# Altium footprint library KNR_Kurs.PcbLib: 250 footprints (part 14 of 16)
Each footprint in its own frame and in the unit in brackets; x right, y up, seen from the top. Pads: shape width x height; smd on the part's side, far side on the other; paste and mask are expansions set on the pad; w line width, h text height; cw(c..) or ccw(c..) is an arc to the next point about the centre after c.
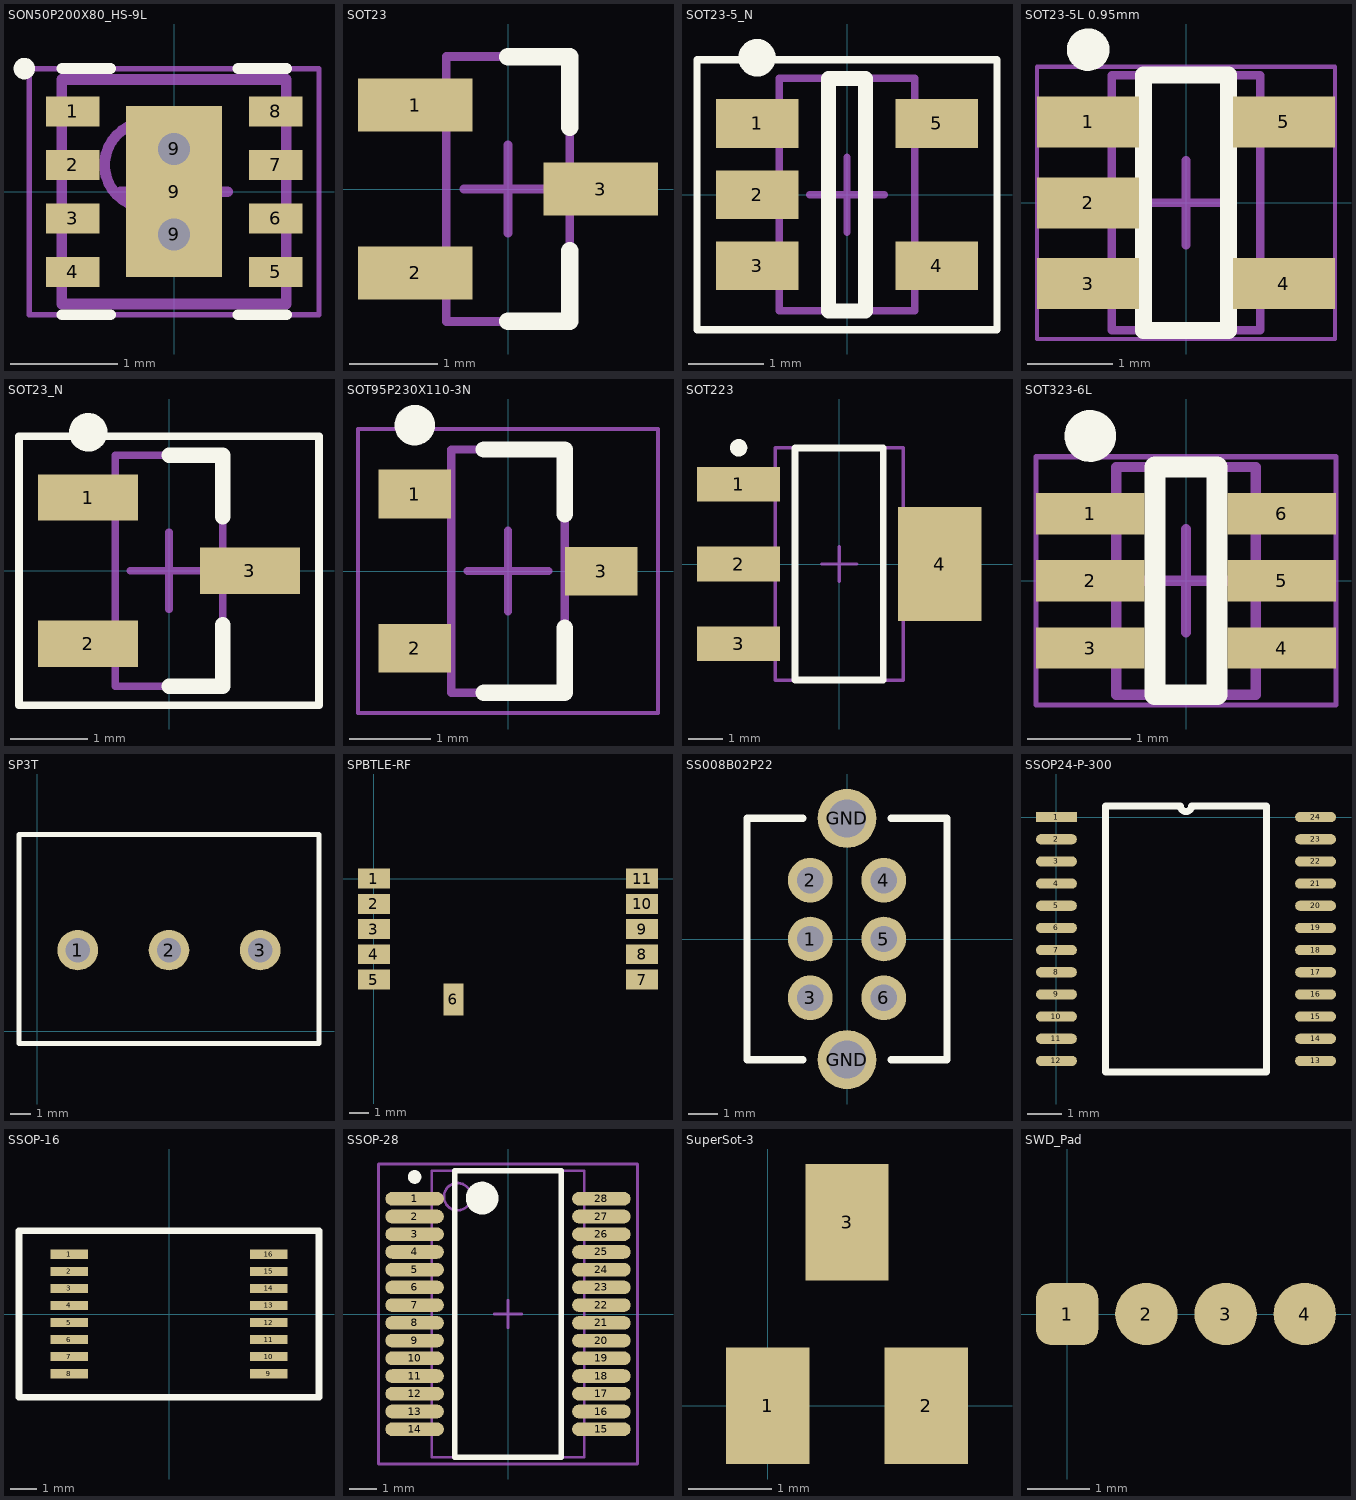
[diagram p13: the footprints below, top view; thin cyan lines are the x and y axes]

## SON50P200X80_HS-9L [mm] "SON, 8-Leads, Body 2,00x2,00mm, Pitch 0,50mm, Thermal Pad 1,60x0,69mm, IPC High Density"
height 0.8
pads (11):
  rect 0.5x0.28 smd mask+0.076: 1(-0.95,0.75) 2(-0.95,0.25) 3(-0.95,-0.25) 4(-0.95,-0.75) 5(0.95,-0.75) 6(0.95,-0.25) 7(0.95,0.25) 8(0.95,0.75)
  round 0.5 hole 0.3 mask+0.076: 9(0,-0.4) 9(0,0.4)
  rect 0.9x1.6 smd mask+0.076: 9(0,0)
Top Overlay:
  circle w0.1: c-1.401,1.151 r0.05
  lines w0.102: -1.05,-1.151 -0.596,-1.151 ; -1.05,1.151 -0.596,1.151 ; 0.596,-1.151 1.05,-1.151 ; 0.596,1.151 1.05,1.151
Mechanical 13:
  circle w0.1: c-0.25,0.25 r0.4
  lines w0.1: -1.05,-1.05 1.05,-1.05 1.05,1.05 -1.05,1.05 -1.05,-1.05
Mechanical 15:
  lines w0.05: -1.355,-1.15 1.355,-1.15 1.355,1.15 -1.355,1.15 -1.355,-1.15
  lines w0.1: -0.5,0 0.5,0 ; 0,-0.5 0,0.5
3D body "User Library-DSG (S-PWSON-N8).step": height 0.8, standoff 0, extent -1.05,-1.05 1.05,1.05

## SOT23 [mm]
pads (3):
  rect 1.3x0.6 smd: 1(-1.05,0.95) 2(-1.05,-0.95) 3(1.05,0)
Top Overlay:
  lines w0.2: 0,-1.5 0.7,-1.5 0.7,-0.7 ; 0,1.5 0.7,1.5 0.7,0.7
Mechanical 13:
  lines w0.1: -0.7,-1.5 0.7,-1.5 0.7,1.5 -0.7,1.5 -0.7,-1.5
Mechanical 15:
  lines w0.1: -0.5,0 0.5,0 ; 0,-0.5 0,0.5
3D body "SOT23.stp": height 1.1, standoff 0, extent -1.6,-1.5 1.6,1.5

## SOT23-5_N [mm] "SOT23, 5-Leads, Body 2.9x1.6mm, Pitch 0.95mm, Lead Span 2.8mm, IPC Medium Density"
height 1.45
pads (5):
  rect 1.1x0.65 smd: 1(-1.2,0.95) 2(-1.2,0) 3(-1.2,-0.95) 4(1.2,-0.95) 5(1.2,0.95)
Top Overlay:
  circle w0.25: c-1.2,1.825 r0.125
  lines w0.1: -2,-1.8 2,-1.8 2,1.8 -2,1.8 -2,-1.8
  lines w0.2: -0.25,-1.55 -0.25,1.55 0.25,1.55 0.25,-1.55 -0.25,-1.55
Mechanical 13:
  lines w0.1: -0.9,-1.55 0.9,-1.55 0.9,1.55 -0.9,1.55 -0.9,-1.55
Mechanical 15:
  lines w0.1: -0.5,0 0.5,0 ; 0,-0.5 0,0.5
3D body "SOT23-5.stp": height 1.1, standoff 0, extent -1.625,-1.5 1.575,1.5

## SOT23-5L 0.95mm [mm] "SOT23, 5-Leads, Body 2,90x2,80mm, Pitch 0,95mm, IPC High Density"
height 1.45
pads (5):
  rect 1.2x0.6 smd: 1(-1.15,0.95) 2(-1.15,0) 3(-1.15,-0.95) 4(1.15,-0.95) 5(1.15,0.95)
Top Overlay:
  circle w0.25: c-1.15,1.8 r0.125
  lines w0.2: -0.5,-1.5 -0.5,1.5 0.5,1.5 0.5,-1.5 -0.5,-1.5
Mechanical 13:
  lines w0.1: -0.875,-1.5 0.875,-1.5 0.875,1.5 -0.875,1.5 -0.875,-1.5
Mechanical 15:
  lines w0.05: -1.75,-1.6 1.75,-1.6 1.75,1.6 -1.75,1.6 -1.75,-1.6
  lines w0.1: -0.5,0 0.5,0 ; 0,-0.5 0,0.5
3D body "User Library-SOT23-5-1.step": height 1.3, standoff 0, extent -1.5,-1.5 1.5,1.5

## SOT23_N [mm]
pads (3):
  rect 1.3x0.6 smd: 1(-1.05,0.95) 2(-1.05,-0.95) 3(1.05,0)
Top Overlay:
  circle w0.25: c-1.05,1.8 r0.125
  lines w0.1: -1.95,-1.75 -1.95,1.75 1.95,1.75 1.95,-1.75 -1.95,-1.75
  lines w0.2: 0,-1.5 0.7,-1.5 0.7,-0.7 ; 0,1.5 0.7,1.5 0.7,0.7
Mechanical 13:
  lines w0.1: -0.7,-1.5 -0.7,1.5 0.7,1.5 0.7,-1.5 -0.7,-1.5
Mechanical 15:
  lines w0.1: -0.5,0 0.5,0 ; 0,-0.5 0,0.5
3D body "SOT23.stp": height 1.1, standoff 0, extent -1.6,-1.5 1.6,1.5

## SOT95P230X110-3N [mm] "SOT23, 3-Leads, Body 2,90x2,30mm, Pitch 0,95mm, IPC Medium Density"
height 1.1
pads (3):
  rect 0.9x0.6 smd: 1(-1.15,0.95) 2(-1.15,-0.95) 3(1.15,0)
Top Overlay:
  circle w0.25: c-1.15,1.8 r0.125
  lines w0.2: -0.3,-1.5 0.7,-1.5 0.7,-0.7 ; -0.3,1.5 0.7,1.5 0.7,0.7
Mechanical 13:
  lines w0.1: -0.7,-1.5 -0.7,1.5 0.7,1.5 0.7,-1.5 -0.7,-1.5
Mechanical 15:
  lines w0.05: -1.85,-1.75 -1.85,1.75 1.85,1.75 1.85,-1.75 -1.85,-1.75
  lines w0.1: -0.5,0 0.5,0 ; 0,-0.5 0,0.5
3D body "User Library-SOT23-3.step": height 1.3, standoff 0, extent -1.4,-1.45 1.4,1.45

## SOT223 [mm]
pads (4):
  rect 2.4x1 smd: 1(-2.9,2.3) 2(-2.9,0) 3(-2.9,-2.3)
  rect 2.4x3.3 smd: 4(2.9,0)
Top Overlay:
  circle w0.25: c-2.9,3.35 r0.125
  lines w0.2: -1.27,-3.35 1.27,-3.35 1.27,3.35 -1.27,3.35 -1.27,-3.35
Mechanical 13:
  lines w0.1: -1.85,-3.35 1.85,-3.35 1.85,3.35 -1.85,3.35 -1.85,-3.35
Mechanical 15:
  lines w0.1: -0.5,0 0.5,0 ; 0,-0.5 0,0.5
3D body "SOT223.stp": height 1.8, standoff 0, extent -3.45,-3.3 3.3,3.2

## SOT323-6L [mm] "SOT23, 6-Leads, Body 2,00x2,10mm, Pitch 0,65mm, IPC High Density"
height 1.1
pads (6):
  rect 1.05x0.4 smd: 1(-0.925,0.65) 2(-0.925,0) 3(-0.925,-0.65) 4(0.925,-0.65) 5(0.925,0) 6(0.925,0.65)
Top Overlay:
  circle w0.25: c-0.925,1.4 r0.125
  lines w0.2: -0.3,-1.1 -0.3,1.1 0.3,1.1 0.3,-1.1 -0.3,-1.1
Mechanical 13:
  lines w0.1: -0.675,-1.1 0.675,-1.1 0.675,1.1 -0.675,1.1 -0.675,-1.1
Mechanical 15:
  lines w0.05: -1.45,-1.2 1.45,-1.2 1.45,1.2 -1.45,1.2 -1.45,-1.2
  lines w0.1: -0.5,0 0.5,0 ; 0,-0.5 0,0.5
3D body "User Library-TSSOP-6 (SOT-23-6 PITCH 0_65).STEP": height 1.1, standoff -0.01, extent -1.125,-1.125 1.125,1.125

## SP3T [mm] "SP3T ON-OFF-ON switch"
pads (3):
  round 2 hole 1.2: 1(2,4) 2(6.5,4) 3(11,4)
Top Overlay:
  lines w0.254: -0.9,-0.6 -0.9,9.7 13.9,9.7 13.9,-0.6 -0.9,-0.6
3D body "SP3T.stp": height 28.24, standoff -1.2, extent -0.833,-1.394 12.961,10.604

## SPBTLE-RF [mm]
pads (11):
  rect 1.6x1 smd mask+0.07: 1(0,0) 2(0,-1.27) 3(0,-2.54) 4(0,-3.81) 5(0,-5.08) 7(13.5,-5.08) 8(13.5,-3.81) 9(13.5,-2.54) 10(13.5,-1.27) 11(13.5,0)
  rect 1x1.6 smd mask+0.07: 6(4,-6.08)
3D body "User Library-SPBTLE.step": height 2, standoff 0, extent 0,-6.08 13.5,5.42

## SS008B02P22 [mm] "Prze³¹cznik suwakowy SS008B02P22"
pads (8):
  round 1.524 hole 0.9: 1(-1.25,0) 2(-1.25,2) 3(-1.25,-2) 4(1.25,2) 5(1.25,0) 6(1.25,-2)
  round 2 hole 1.3: GND(0,-4.1) GND(0,4.1)
Top Overlay:
  lines w0.254: -1.5,-4.1 -3.4,-4.1 -3.4,4.1 -1.5,4.1 ; 1.5,-4.1 3.4,-4.1 3.4,4.1 1.5,4.1
3D body "SS008B02P22.stp": height 8.2, standoff -2, extent -3.4,-4.3 3.4,4.3

## SSOP24-P-300 [mm]
pads (24):
  rect 1.2x0.3 smd: 1(0,0)
  oval 1.2x0.3 smd: 2(0,-0.65) 3(0,-1.3) 4(0,-1.95) 5(0,-2.6) 6(0,-3.25) 7(0,-3.9) 8(0,-4.55) 9(0,-5.2) 10(0,-5.85) 11(0,-6.5) 12(0,-7.15) 13(7.6,-7.15) 14(7.6,-6.5) 15(7.6,-5.85) 16(7.6,-5.2) 17(7.6,-4.55) 18(7.6,-3.9) 19(7.6,-3.25) 20(7.6,-2.6) 21(7.6,-1.95) 22(7.6,-1.3) 23(7.6,-0.65) 24(7.6,0)
Top Overlay:
  lines w0.2: 1.435,-7.475 6.165,-7.475 6.165,0.325 3.962,0.325 cw(c3.8,0.325) 3.638,0.325 1.435,0.325 1.435,-7.475
3D body "SSOP24-P-300.stp": height 1.6, standoff 0, extent 0,-7.75 7.6,0.55

## SSOP-16 [mm]
pads (16):
  rect 1.43x0.35 smd: 1(-3.795,2.275) 2(-3.795,1.625) 3(-3.795,0.975) 4(-3.795,0.325) 5(-3.795,-0.325) 6(-3.795,-0.975) 7(-3.795,-1.625) 8(-3.795,-2.275) 9(3.795,-2.275) 10(3.795,-1.625) 11(3.795,-0.975) 12(3.795,-0.325) 13(3.795,0.325) 14(3.795,0.975) 15(3.795,1.625) 16(3.795,2.275)
Top Overlay:
  lines w0.254: -5.715,-3.175 5.715,-3.175 5.715,3.175 -5.715,3.175 -5.715,-3.175
3D body "SSOP-16.stp": height 1.86, standoff -0.2, extent -4.15,-3.1 4.15,3.1

## SSOP-28 [mm] "SOP, 28-Leads, Body 10,5x5,6mm (max), Pitch 0,65mm"
height 2
pads (28):
  oval 2.15x0.5 smd: 1(-3.425,4.225) 2(-3.425,3.575) 3(-3.425,2.925) 4(-3.425,2.275) 5(-3.425,1.625) 6(-3.425,0.975) 7(-3.425,0.325) 8(-3.425,-0.325) 9(-3.425,-0.975) 10(-3.425,-1.625) 11(-3.425,-2.275) 12(-3.425,-2.925) 13(-3.425,-3.575) 14(-3.425,-4.225) 15(3.425,-4.225) 16(3.425,-3.575) 17(3.425,-2.925) 18(3.425,-2.275) 19(3.425,-1.625) 20(3.425,-0.975) 21(3.425,-0.325) 22(3.425,0.325) 23(3.425,0.975) 24(3.425,1.625) 25(3.425,2.275) 26(3.425,2.925) 27(3.425,3.575) 28(3.425,4.225)
Top Overlay:
  circle w0.6: c-0.95,4.25 r0.3
  circle w0.25: c-3.425,5.025 r0.125
  lines w0.2: -1.95,-5.25 1.95,-5.25 1.95,5.25 -1.95,5.25 -1.95,-5.25
Mechanical 13:
  circle w0.1: c-1.85,4.3 r0.5
  lines w0.1: -2.8,-5.25 2.8,-5.25 2.8,5.25 -2.8,5.25 -2.8,-5.25
Mechanical 15:
  lines w0.1: -0.5,0 0.5,0 ; 0,-0.5 0,0.5 ; -4.75,-5.5 4.75,-5.5 4.75,5.5 -4.75,5.5 -4.75,-5.5
3D body "SSOP-28.stp": height 1.8, standoff 0, extent -4.2,-5.25 4.2,5.25

## SuperSot-3 [mm]
pads (3):
  rect 1x1.4 smd: 1(0,0) 2(1.9,0) 3(0.95,2.2)
3D body "User Library-SOT23-3.step": height 1.3, standoff 0, extent -0.5,-0.3 2.4,2.5

## SWD_Pad [mm]
pads (4):
  rrect50% 1x1 smd: 1(0,0)
  round 1 smd: 2(1.27,0) 3(2.54,0) 4(3.81,0)